# Altium integrated library Lattice CPLD ispLSI.IntLib: 471 symbols (part 15 of 26) (continued)
## ispLSI3256A-50LM (continued)
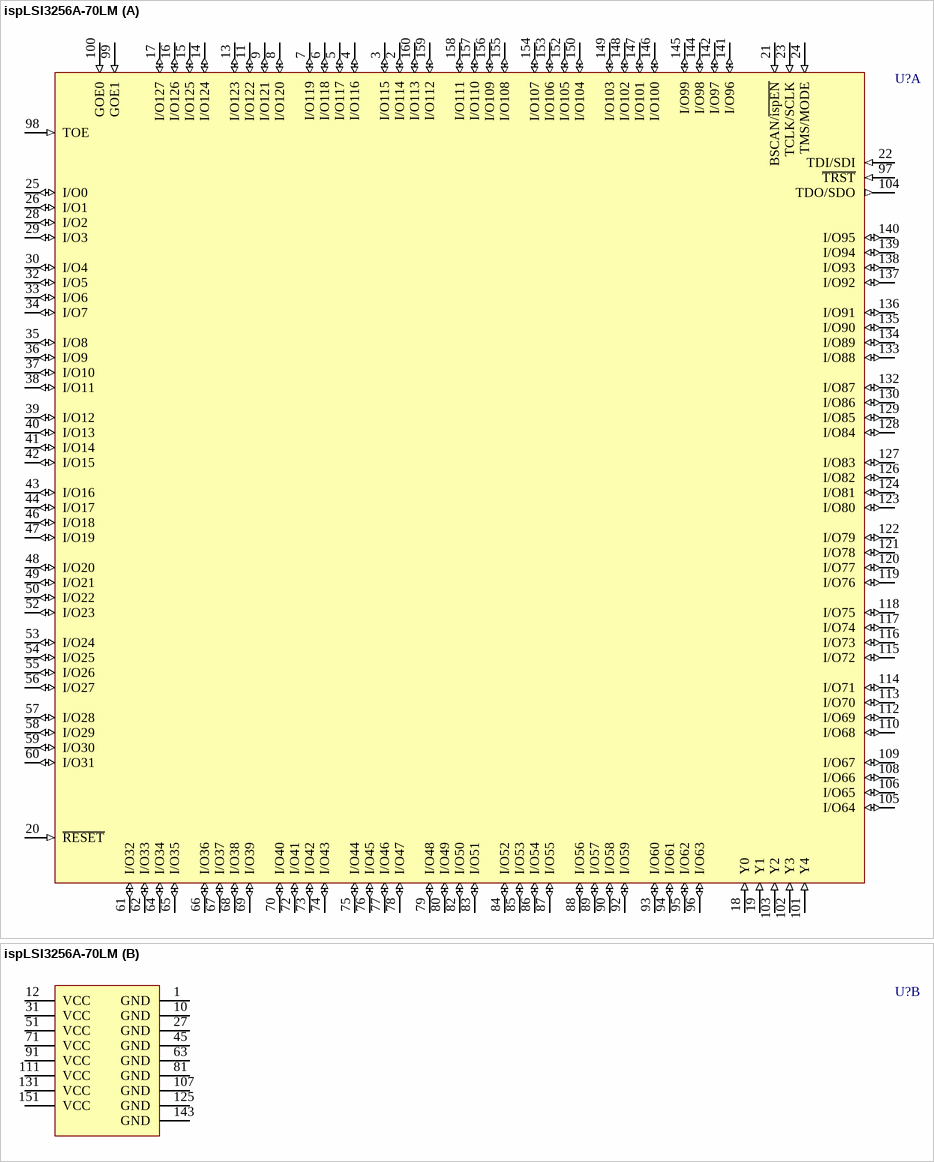
[diagram p133: symbol ispLSI3256A-70LM]

## ispLSI3256A-70LM
designator U?
In-System Programmable High-Density PLD; Note: Pins 21, 22, 23, 24 and 104 have dual function capability.; Published: 23-Sep-2002; LatestRevisionDate: 13-Apr-2006; LatestRevisionNote: IPC-7351 Footprint Added.; DatasheetVersion: May-1999; PackageVersion: May-1999; PackageReference: MQFP160; Publisher: Altium Limited; PackageDescription: 160-Pin Quad Flat Pack 0.65 mm Pitch; Code_IPC: QFP65P3120X3120-160; ComponentLink1Description: Manufacturer Link; ComponentLink1URL: http://www.latticesemi.com/products/mature/index.cfm; ComponentLink2Description: Datasheet; ComponentLink2URL: http://www.latticesemi.com/lit/docs/datasheets/cpld/3256a.pdf
footprint MQFP160_N (QFP, 160-Leads, Body 27.7 x 27.7mm, Pitch 0.65mm, IPC Medium Density)
footprint MQFP160_L (QFP, 160-Leads, Body 27.7 x 27.7mm, Pitch 0.65mm, IPC High Density)
footprint MQFP160_M (QFP, 160-Leads, Body 27.7 x 27.7mm, Pitch 0.65mm, IPC Low Density)
3D model 3256A-MQFP160 (160-Pin Quad Flat Pack 0.65 mm Pitch)
part A pins: 2 I/O114 (io), 3 I/O115 (io), 4 I/O116 (io), 5 I/O117 (io), 6 I/O118 (io), 7 I/O119 (io), 8 I/O120 (io), 9 I/O121 (io), 11 I/O122 (io), 13 I/O123 (io), 14 I/O124 (io), 15 I/O125 (io), 16 I/O126 (io), 17 I/O127 (io), 18 Y0 (in), 19 Y1 (in), 20 ~{RESET} (in), 21 BSCAN/~{ispEN} (in), 22 TDI/SDI (in), 23 TCLK/SCLK (in), 24 TMS/MODE (in), 25 I/O0 (io), 26 I/O1 (io), 28 I/O2 (io), 29 I/O3 (io), 30 I/O4 (io), 32 I/O5 (io), 33 I/O6 (io), 34 I/O7 (io), 35 I/O8 (io), 36 I/O9 (io), 37 I/O10 (io), 38 I/O11 (io), 39 I/O12 (io), 40 I/O13 (io), 41 I/O14 (io), 42 I/O15 (io), 43 I/O16 (io), 44 I/O17 (io), 46 I/O18 (io), 47 I/O19 (io), 48 I/O20 (io), 49 I/O21 (io), 50 I/O22 (io), 52 I/O23 (io), 53 I/O24 (io), 54 I/O25 (io), 55 I/O26 (io), 56 I/O27 (io), 57 I/O28 (io), 58 I/O29 (io), 59 I/O30 (io), 60 I/O31 (io), 61 I/O32 (io), 62 I/O33 (io), 64 I/O34 (io), 65 I/O35 (io), 66 I/O36 (io), 67 I/O37 (io), 68 I/O38 (io), 69 I/O39 (io), 70 I/O40 (io), 72 I/O41 (io), 73 I/O42 (io), 74 I/O43 (io), 75 I/O44 (io), 76 I/O45 (io), 77 I/O46 (io), 78 I/O47 (io), 79 I/O48 (io), 80 I/O49 (io), 82 I/O50 (io), 83 I/O51 (io), 84 I/O52 (io), 85 I/O53 (io), 86 I/O54 (io), 87 I/O55 (io), 88 I/O56 (io), 89 I/O57 (io), 90 I/O58 (io), 92 I/O59 (io), 93 I/O60 (io), 94 I/O61 (io), 95 I/O62 (io), 96 I/O63 (io), 97 ~{TRST} (in), 98 TOE (in), 99 GOE1 (in), 100 GOE0 (in), 101 Y4 (in), 102 Y3 (in), 103 Y2 (in), 104 TDO/SDO (out), 105 I/O64 (io), 106 I/O65 (io), 108 I/O66 (io), 109 I/O67 (io), 110 I/O68 (io), 112 I/O69 (io), 113 I/O70 (io), 114 I/O71 (io), 115 I/O72 (io), 116 I/O73 (io), 117 I/O74 (io), 118 I/O75 (io), 119 I/O76 (io), 120 I/O77 (io), 121 I/O78 (io), 122 I/O79 (io), 123 I/O80 (io), 124 I/O81 (io), 126 I/O82 (io), 127 I/O83 (io), 128 I/O84 (io), 129 I/O85 (io), 130 I/O86 (io), 132 I/O87 (io), 133 I/O88 (io), 134 I/O89 (io), 135 I/O90 (io), 136 I/O91 (io), 137 I/O92 (io), 138 I/O93 (io), 139 I/O94 (io), 140 I/O95 (io), 141 I/O96 (io), 142 I/O97 (io), 144 I/O98 (io), 145 I/O99 (io), 146 I/O100 (io), 147 I/O101 (io), 148 I/O102 (io), 149 I/O103 (io), 150 I/O104 (io), 152 I/O105 (io), 153 I/O106 (io), 154 I/O107 (io), 155 I/O108 (io), 156 I/O109 (io), 157 I/O110 (io), 158 I/O111 (io), 159 I/O112 (io), 160 I/O113 (io)
part B pins: 1 GND (power), 10 GND (power), 12 VCC (power), 27 GND (power), 31 VCC (power), 45 GND (power), 51 VCC (power), 63 GND (power), 71 VCC (power), 81 GND (power), 91 VCC (power), 107 GND (power), 111 VCC (power), 125 GND (power), 131 VCC (power), 143 GND (power), 151 VCC (power)

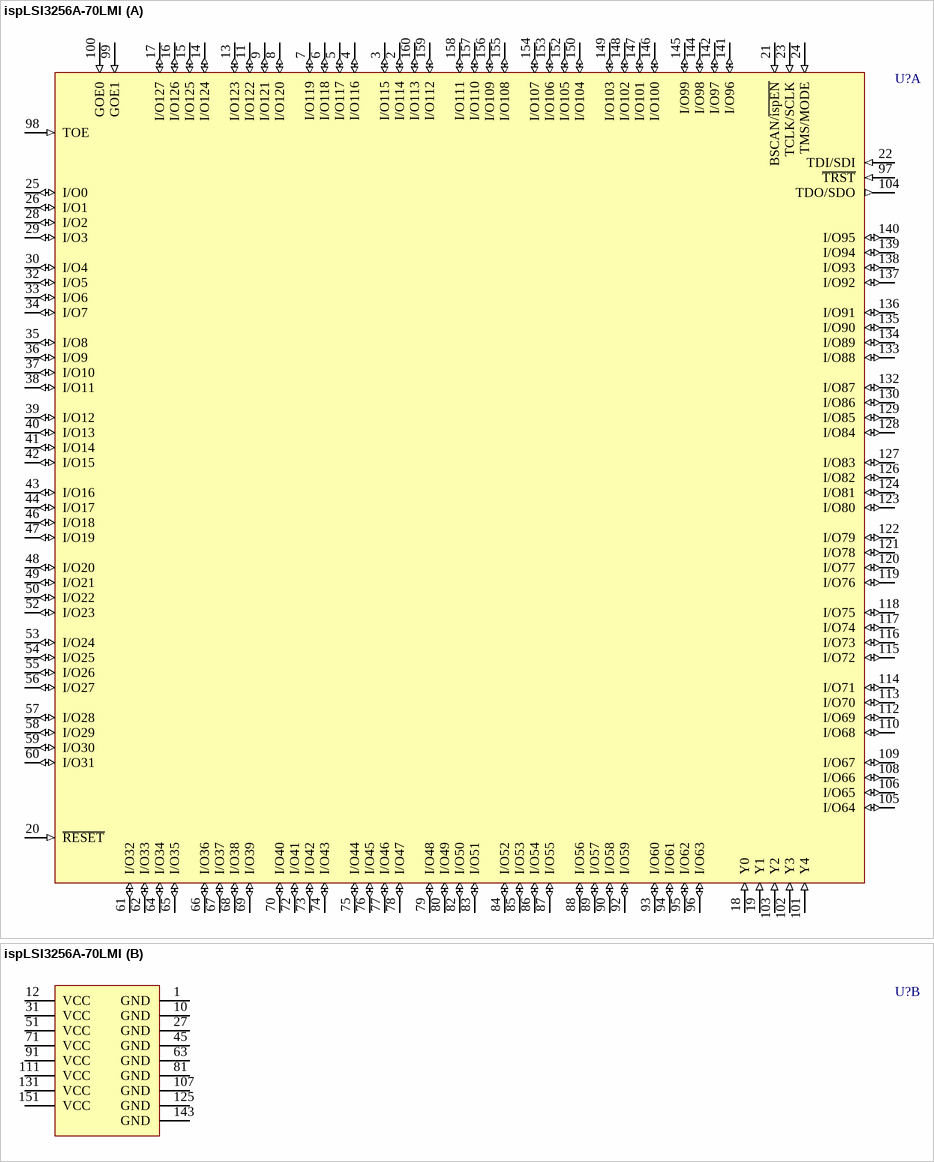
[diagram p134: symbol ispLSI3256A-70LMI]

## ispLSI3256A-70LMI
designator U?
In-System Programmable High-Density PLD; Note: Pins 21, 22, 23, 24 and 104 have dual function capability.; Published: 23-Sep-2002; LatestRevisionDate: 13-Apr-2006; LatestRevisionNote: IPC-7351 Footprint Added.; DatasheetVersion: May-1999; PackageVersion: May-1999; PackageReference: MQFP160; Publisher: Altium Limited; PackageDescription: 160-Pin Quad Flat Pack 0.65 mm Pitch; Code_IPC: QFP65P3120X3120-160; ComponentLink1Description: Manufacturer Link; ComponentLink1URL: http://www.latticesemi.com/products/mature/index.cfm; ComponentLink2Description: Datasheet; ComponentLink2URL: http://www.latticesemi.com/lit/docs/datasheets/cpld/3256a.pdf
footprint MQFP160_N (QFP, 160-Leads, Body 27.7 x 27.7mm, Pitch 0.65mm, IPC Medium Density)
footprint MQFP160_L (QFP, 160-Leads, Body 27.7 x 27.7mm, Pitch 0.65mm, IPC High Density)
footprint MQFP160_M (QFP, 160-Leads, Body 27.7 x 27.7mm, Pitch 0.65mm, IPC Low Density)
3D model 3256A-MQFP160 (160-Pin Quad Flat Pack 0.65 mm Pitch)
part A pins: 2 I/O114 (io), 3 I/O115 (io), 4 I/O116 (io), 5 I/O117 (io), 6 I/O118 (io), 7 I/O119 (io), 8 I/O120 (io), 9 I/O121 (io), 11 I/O122 (io), 13 I/O123 (io), 14 I/O124 (io), 15 I/O125 (io), 16 I/O126 (io), 17 I/O127 (io), 18 Y0 (in), 19 Y1 (in), 20 ~{RESET} (in), 21 BSCAN/~{ispEN} (in), 22 TDI/SDI (in), 23 TCLK/SCLK (in), 24 TMS/MODE (in), 25 I/O0 (io), 26 I/O1 (io), 28 I/O2 (io), 29 I/O3 (io), 30 I/O4 (io), 32 I/O5 (io), 33 I/O6 (io), 34 I/O7 (io), 35 I/O8 (io), 36 I/O9 (io), 37 I/O10 (io), 38 I/O11 (io), 39 I/O12 (io), 40 I/O13 (io), 41 I/O14 (io), 42 I/O15 (io), 43 I/O16 (io), 44 I/O17 (io), 46 I/O18 (io), 47 I/O19 (io), 48 I/O20 (io), 49 I/O21 (io), 50 I/O22 (io), 52 I/O23 (io), 53 I/O24 (io), 54 I/O25 (io), 55 I/O26 (io), 56 I/O27 (io), 57 I/O28 (io), 58 I/O29 (io), 59 I/O30 (io), 60 I/O31 (io), 61 I/O32 (io), 62 I/O33 (io), 64 I/O34 (io), 65 I/O35 (io), 66 I/O36 (io), 67 I/O37 (io), 68 I/O38 (io), 69 I/O39 (io), 70 I/O40 (io), 72 I/O41 (io), 73 I/O42 (io), 74 I/O43 (io), 75 I/O44 (io), 76 I/O45 (io), 77 I/O46 (io), 78 I/O47 (io), 79 I/O48 (io), 80 I/O49 (io), 82 I/O50 (io), 83 I/O51 (io), 84 I/O52 (io), 85 I/O53 (io), 86 I/O54 (io), 87 I/O55 (io), 88 I/O56 (io), 89 I/O57 (io), 90 I/O58 (io), 92 I/O59 (io), 93 I/O60 (io), 94 I/O61 (io), 95 I/O62 (io), 96 I/O63 (io), 97 ~{TRST} (in), 98 TOE (in), 99 GOE1 (in), 100 GOE0 (in), 101 Y4 (in), 102 Y3 (in), 103 Y2 (in), 104 TDO/SDO (out), 105 I/O64 (io), 106 I/O65 (io), 108 I/O66 (io), 109 I/O67 (io), 110 I/O68 (io), 112 I/O69 (io), 113 I/O70 (io), 114 I/O71 (io), 115 I/O72 (io), 116 I/O73 (io), 117 I/O74 (io), 118 I/O75 (io), 119 I/O76 (io), 120 I/O77 (io), 121 I/O78 (io), 122 I/O79 (io), 123 I/O80 (io), 124 I/O81 (io), 126 I/O82 (io), 127 I/O83 (io), 128 I/O84 (io), 129 I/O85 (io), 130 I/O86 (io), 132 I/O87 (io), 133 I/O88 (io), 134 I/O89 (io), 135 I/O90 (io), 136 I/O91 (io), 137 I/O92 (io), 138 I/O93 (io), 139 I/O94 (io), 140 I/O95 (io), 141 I/O96 (io), 142 I/O97 (io), 144 I/O98 (io), 145 I/O99 (io), 146 I/O100 (io), 147 I/O101 (io), 148 I/O102 (io), 149 I/O103 (io), 150 I/O104 (io), 152 I/O105 (io), 153 I/O106 (io), 154 I/O107 (io), 155 I/O108 (io), 156 I/O109 (io), 157 I/O110 (io), 158 I/O111 (io), 159 I/O112 (io), 160 I/O113 (io)
part B pins: 1 GND (power), 10 GND (power), 12 VCC (power), 27 GND (power), 31 VCC (power), 45 GND (power), 51 VCC (power), 63 GND (power), 71 VCC (power), 81 GND (power), 91 VCC (power), 107 GND (power), 111 VCC (power), 125 GND (power), 131 VCC (power), 143 GND (power), 151 VCC (power)

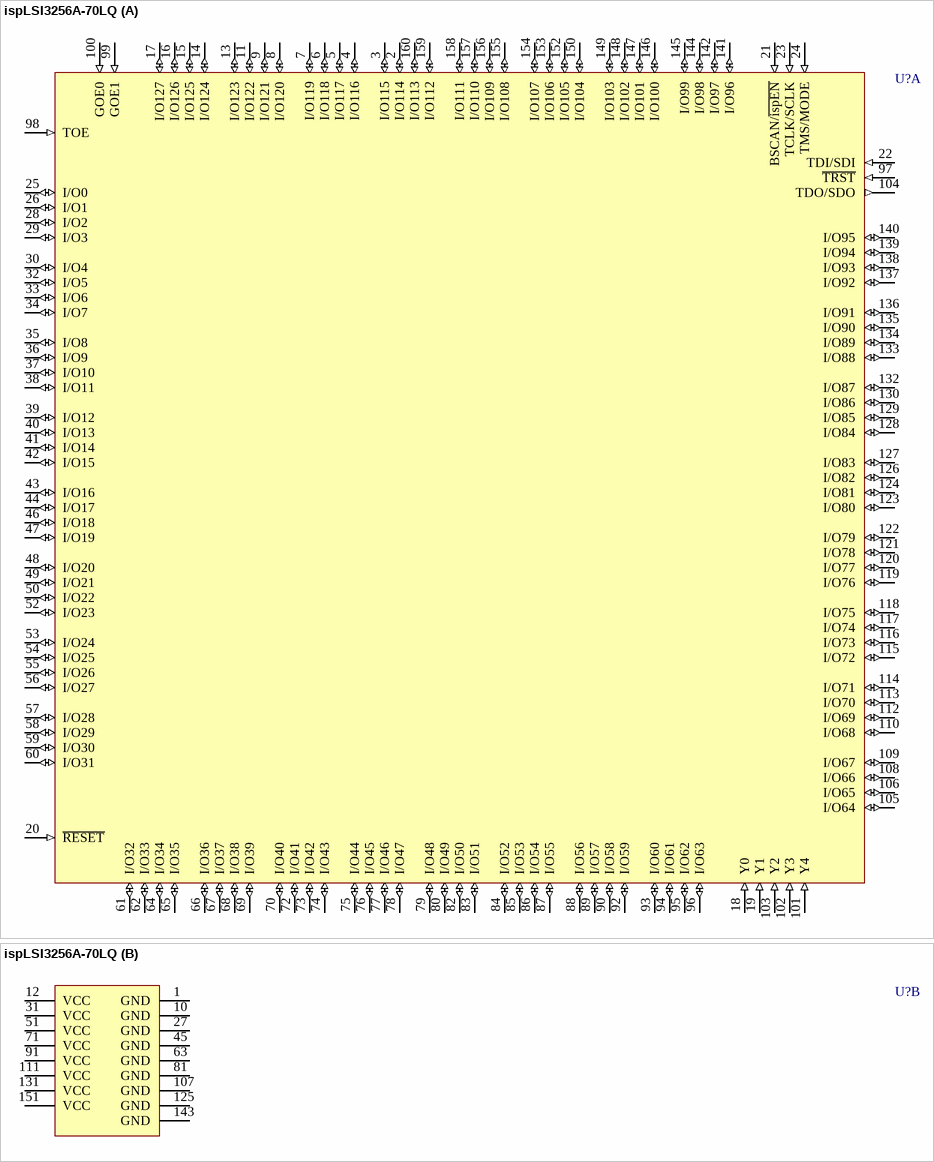
[diagram p135: symbol ispLSI3256A-70LQ]

## ispLSI3256A-70LQ
designator U?
In-System Programmable High-Density PLD; Note: Pins 21, 22, 23, 24 and 104 have dual function capability.; Published: 23-Sep-2002; LatestRevisionDate: 13-Apr-2006; LatestRevisionNote: IPC-7351 Footprint Added.; DatasheetVersion: May-1999; PackageVersion: pkg_32, Aug-2005; PackageReference: PQFP160; Publisher: Altium Limited; PackageDescription: 160-Pin Quad Flat Pack 0.65 mm Pitch; Code_IPC: QFP65P3120X3120-160; ComponentLink1Description: Manufacturer Link; ComponentLink1URL: http://www.latticesemi.com/products/mature/index.cfm; ComponentLink2Description: Datasheet; ComponentLink2URL: http://www.latticesemi.com/lit/docs/datasheets/cpld/3256a.pdf
footprint PQFP160_N (QFP, 160-Leads, Body 28 x 28mm, Pitch 0.65mm, IPC Medium Density)
footprint PQFP160_L (QFP, 160-Leads, Body 28 x 28mm, Pitch 0.65mm, IPC High Density)
footprint PQFP160_M (QFP, 160-Leads, Body 28 x 28mm, Pitch 0.65mm, IPC Low Density)
3D model 3256A-PQFP160 (160-Pin Quad Flat Pack 0.65 mm Pitch)
part A pins: 2 I/O114 (io), 3 I/O115 (io), 4 I/O116 (io), 5 I/O117 (io), 6 I/O118 (io), 7 I/O119 (io), 8 I/O120 (io), 9 I/O121 (io), 11 I/O122 (io), 13 I/O123 (io), 14 I/O124 (io), 15 I/O125 (io), 16 I/O126 (io), 17 I/O127 (io), 18 Y0 (in), 19 Y1 (in), 20 ~{RESET} (in), 21 BSCAN/~{ispEN} (in), 22 TDI/SDI (in), 23 TCLK/SCLK (in), 24 TMS/MODE (in), 25 I/O0 (io), 26 I/O1 (io), 28 I/O2 (io), 29 I/O3 (io), 30 I/O4 (io), 32 I/O5 (io), 33 I/O6 (io), 34 I/O7 (io), 35 I/O8 (io), 36 I/O9 (io), 37 I/O10 (io), 38 I/O11 (io), 39 I/O12 (io), 40 I/O13 (io), 41 I/O14 (io), 42 I/O15 (io), 43 I/O16 (io), 44 I/O17 (io), 46 I/O18 (io), 47 I/O19 (io), 48 I/O20 (io), 49 I/O21 (io), 50 I/O22 (io), 52 I/O23 (io), 53 I/O24 (io), 54 I/O25 (io), 55 I/O26 (io), 56 I/O27 (io), 57 I/O28 (io), 58 I/O29 (io), 59 I/O30 (io), 60 I/O31 (io), 61 I/O32 (io), 62 I/O33 (io), 64 I/O34 (io), 65 I/O35 (io), 66 I/O36 (io), 67 I/O37 (io), 68 I/O38 (io), 69 I/O39 (io), 70 I/O40 (io), 72 I/O41 (io), 73 I/O42 (io), 74 I/O43 (io), 75 I/O44 (io), 76 I/O45 (io), 77 I/O46 (io), 78 I/O47 (io), 79 I/O48 (io), 80 I/O49 (io), 82 I/O50 (io), 83 I/O51 (io), 84 I/O52 (io), 85 I/O53 (io), 86 I/O54 (io), 87 I/O55 (io), 88 I/O56 (io), 89 I/O57 (io), 90 I/O58 (io), 92 I/O59 (io), 93 I/O60 (io), 94 I/O61 (io), 95 I/O62 (io), 96 I/O63 (io), 97 ~{TRST} (in), 98 TOE (in), 99 GOE1 (in), 100 GOE0 (in), 101 Y4 (in), 102 Y3 (in), 103 Y2 (in), 104 TDO/SDO (out), 105 I/O64 (io), 106 I/O65 (io), 108 I/O66 (io), 109 I/O67 (io), 110 I/O68 (io), 112 I/O69 (io), 113 I/O70 (io), 114 I/O71 (io), 115 I/O72 (io), 116 I/O73 (io), 117 I/O74 (io), 118 I/O75 (io), 119 I/O76 (io), 120 I/O77 (io), 121 I/O78 (io), 122 I/O79 (io), 123 I/O80 (io), 124 I/O81 (io), 126 I/O82 (io), 127 I/O83 (io), 128 I/O84 (io), 129 I/O85 (io), 130 I/O86 (io), 132 I/O87 (io), 133 I/O88 (io), 134 I/O89 (io), 135 I/O90 (io), 136 I/O91 (io), 137 I/O92 (io), 138 I/O93 (io), 139 I/O94 (io), 140 I/O95 (io), 141 I/O96 (io), 142 I/O97 (io), 144 I/O98 (io), 145 I/O99 (io), 146 I/O100 (io), 147 I/O101 (io), 148 I/O102 (io), 149 I/O103 (io), 150 I/O104 (io), 152 I/O105 (io), 153 I/O106 (io), 154 I/O107 (io), 155 I/O108 (io), 156 I/O109 (io), 157 I/O110 (io), 158 I/O111 (io), 159 I/O112 (io), 160 I/O113 (io)
part B pins: 1 GND (power), 10 GND (power), 12 VCC (power), 27 GND (power), 31 VCC (power), 45 GND (power), 51 VCC (power), 63 GND (power), 71 VCC (power), 81 GND (power), 91 VCC (power), 107 GND (power), 111 VCC (power), 125 GND (power), 131 VCC (power), 143 GND (power), 151 VCC (power)

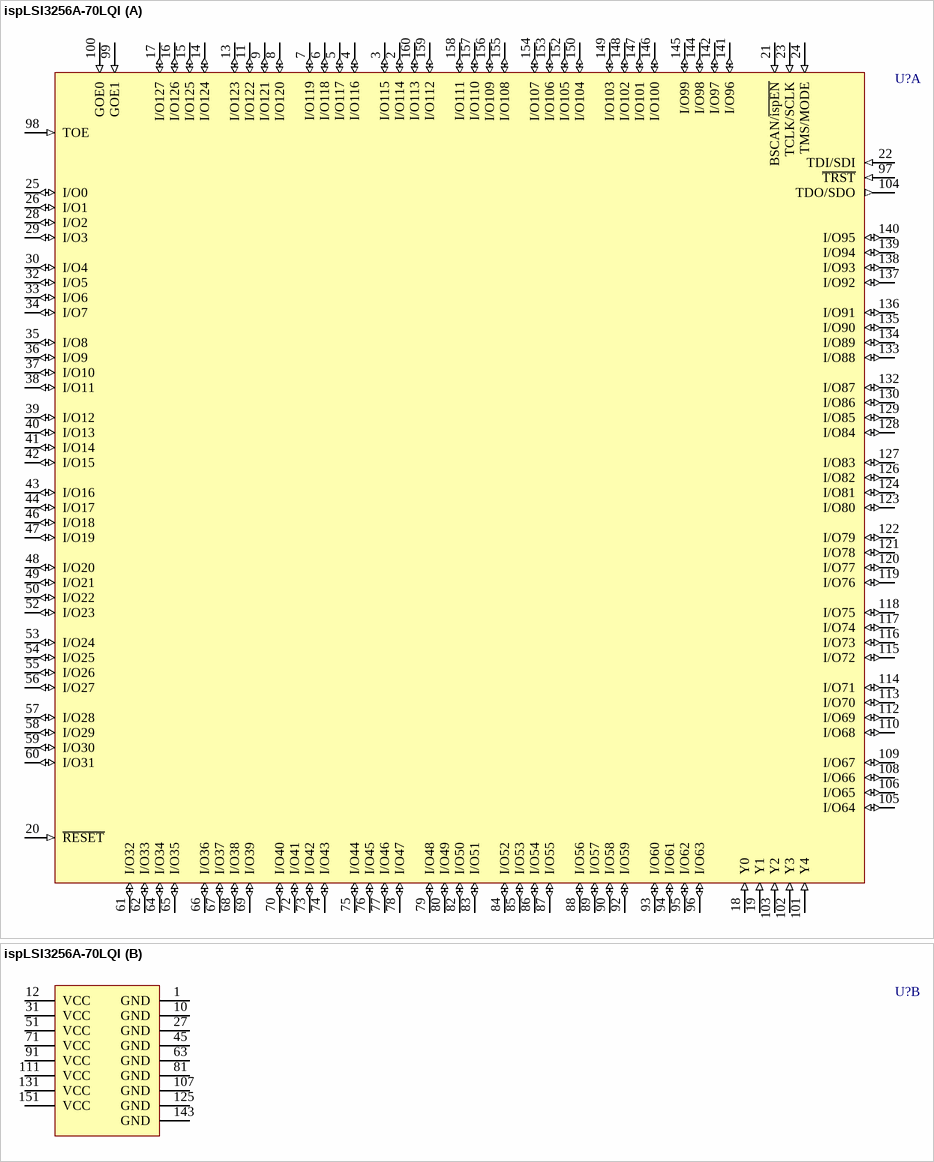
[diagram p136: symbol ispLSI3256A-70LQI]

## ispLSI3256A-70LQI
designator U?
In-System Programmable High-Density PLD; Note: Pins 21, 22, 23, 24 and 104 have dual function capability.; Published: 23-Sep-2002; LatestRevisionDate: 13-Apr-2006; LatestRevisionNote: IPC-7351 Footprint Added.; DatasheetVersion: May-1999; PackageVersion: pkg_32, Aug-2005; PackageReference: PQFP160; Publisher: Altium Limited; PackageDescription: 160-Pin Quad Flat Pack 0.65 mm Pitch; Code_IPC: QFP65P3120X3120-160; ComponentLink1Description: Manufacturer Link; ComponentLink1URL: http://www.latticesemi.com/products/mature/index.cfm; ComponentLink2Description: Datasheet; ComponentLink2URL: http://www.latticesemi.com/lit/docs/datasheets/cpld/3256a.pdf
footprint PQFP160_N (QFP, 160-Leads, Body 28 x 28mm, Pitch 0.65mm, IPC Medium Density)
footprint PQFP160_L (QFP, 160-Leads, Body 28 x 28mm, Pitch 0.65mm, IPC High Density)
footprint PQFP160_M (QFP, 160-Leads, Body 28 x 28mm, Pitch 0.65mm, IPC Low Density)
3D model 3256A-PQFP160 (160-Pin Quad Flat Pack 0.65 mm Pitch)
part A pins: 2 I/O114 (io), 3 I/O115 (io), 4 I/O116 (io), 5 I/O117 (io), 6 I/O118 (io), 7 I/O119 (io), 8 I/O120 (io), 9 I/O121 (io), 11 I/O122 (io), 13 I/O123 (io), 14 I/O124 (io), 15 I/O125 (io), 16 I/O126 (io), 17 I/O127 (io), 18 Y0 (in), 19 Y1 (in), 20 ~{RESET} (in), 21 BSCAN/~{ispEN} (in), 22 TDI/SDI (in), 23 TCLK/SCLK (in), 24 TMS/MODE (in), 25 I/O0 (io), 26 I/O1 (io), 28 I/O2 (io), 29 I/O3 (io), 30 I/O4 (io), 32 I/O5 (io), 33 I/O6 (io), 34 I/O7 (io), 35 I/O8 (io), 36 I/O9 (io), 37 I/O10 (io), 38 I/O11 (io), 39 I/O12 (io), 40 I/O13 (io), 41 I/O14 (io), 42 I/O15 (io), 43 I/O16 (io), 44 I/O17 (io), 46 I/O18 (io), 47 I/O19 (io), 48 I/O20 (io), 49 I/O21 (io), 50 I/O22 (io), 52 I/O23 (io), 53 I/O24 (io), 54 I/O25 (io), 55 I/O26 (io), 56 I/O27 (io), 57 I/O28 (io), 58 I/O29 (io), 59 I/O30 (io), 60 I/O31 (io), 61 I/O32 (io), 62 I/O33 (io), 64 I/O34 (io), 65 I/O35 (io), 66 I/O36 (io), 67 I/O37 (io), 68 I/O38 (io), 69 I/O39 (io), 70 I/O40 (io), 72 I/O41 (io), 73 I/O42 (io), 74 I/O43 (io), 75 I/O44 (io), 76 I/O45 (io), 77 I/O46 (io), 78 I/O47 (io), 79 I/O48 (io), 80 I/O49 (io), 82 I/O50 (io), 83 I/O51 (io), 84 I/O52 (io), 85 I/O53 (io), 86 I/O54 (io), 87 I/O55 (io), 88 I/O56 (io), 89 I/O57 (io), 90 I/O58 (io), 92 I/O59 (io), 93 I/O60 (io), 94 I/O61 (io), 95 I/O62 (io), 96 I/O63 (io), 97 ~{TRST} (in), 98 TOE (in), 99 GOE1 (in), 100 GOE0 (in), 101 Y4 (in), 102 Y3 (in), 103 Y2 (in), 104 TDO/SDO (out), 105 I/O64 (io), 106 I/O65 (io), 108 I/O66 (io), 109 I/O67 (io), 110 I/O68 (io), 112 I/O69 (io), 113 I/O70 (io), 114 I/O71 (io), 115 I/O72 (io), 116 I/O73 (io), 117 I/O74 (io), 118 I/O75 (io), 119 I/O76 (io), 120 I/O77 (io), 121 I/O78 (io), 122 I/O79 (io), 123 I/O80 (io), 124 I/O81 (io), 126 I/O82 (io), 127 I/O83 (io), 128 I/O84 (io), 129 I/O85 (io), 130 I/O86 (io), 132 I/O87 (io), 133 I/O88 (io), 134 I/O89 (io), 135 I/O90 (io), 136 I/O91 (io), 137 I/O92 (io), 138 I/O93 (io), 139 I/O94 (io), 140 I/O95 (io), 141 I/O96 (io), 142 I/O97 (io), 144 I/O98 (io), 145 I/O99 (io), 146 I/O100 (io), 147 I/O101 (io), 148 I/O102 (io), 149 I/O103 (io), 150 I/O104 (io), 152 I/O105 (io), 153 I/O106 (io), 154 I/O107 (io), 155 I/O108 (io), 156 I/O109 (io), 157 I/O110 (io), 158 I/O111 (io), 159 I/O112 (io), 160 I/O113 (io)
part B pins: 1 GND (power), 10 GND (power), 12 VCC (power), 27 GND (power), 31 VCC (power), 45 GND (power), 51 VCC (power), 63 GND (power), 71 VCC (power), 81 GND (power), 91 VCC (power), 107 GND (power), 111 VCC (power), 125 GND (power), 131 VCC (power), 143 GND (power), 151 VCC (power)
